# Altium integrated library Diode-SMD_V2.IntLib: 415 symbols (part 1 of 2) (continued)
## BAV19WS-TP_SOD323 (continued)
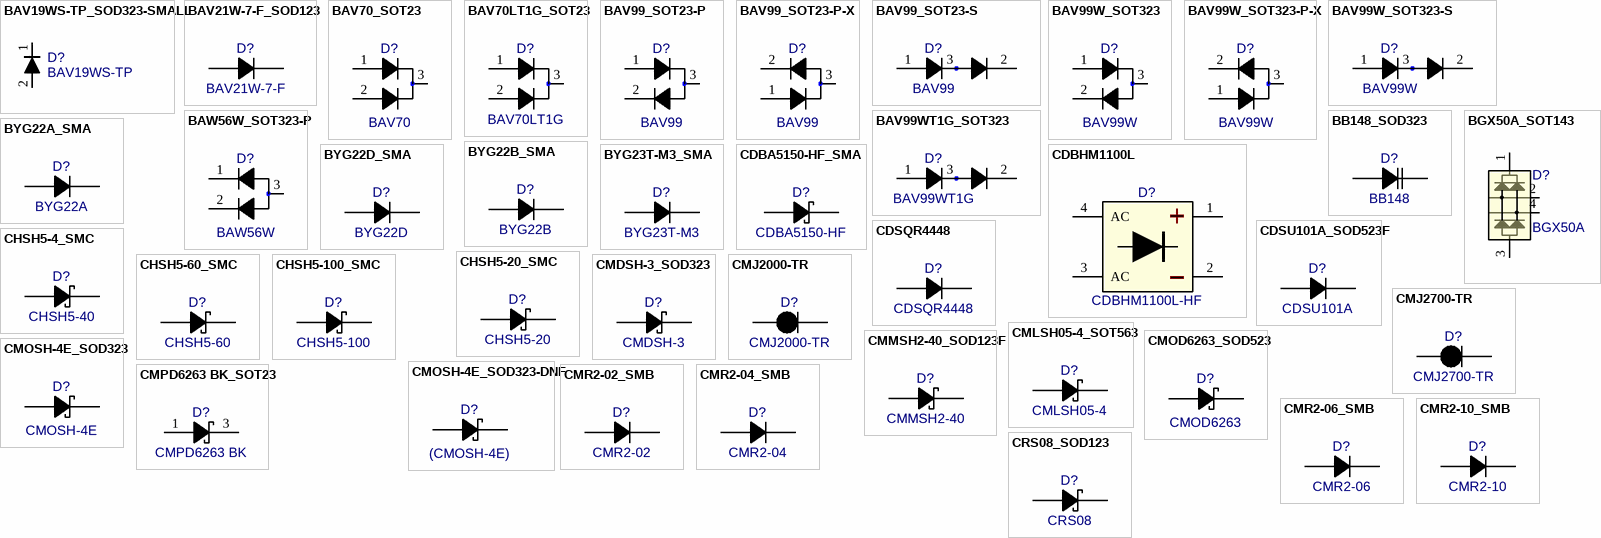
[diagram p3: symbols BAV19WS-TP_SOD323-SMALL to CRS08_SOD123]

## BAV19WS-TP_SOD323-SMALL
designator D?, comment BAV19WS-TP
Diode General  10V 200mA; Manufacturer: MCC; Package: SOD323; EDM-PN: *; Text2: *; Text1: *; Value: BAV19WS-TP; SAAB PN: *; Part Number: BAV19WS-TP; DCE Part No: *
footprint SOD323 (Diode, SOD323 2-Leads, Body 1.7x1.25mm, IPC Medium Density)
pins: 1 C, 2 A

## BAV21W-7-F_SOD123
designator D?, comment BAV21W-7-F
Diode Standard 200V 200mA; Manufacturer: Diodes; Package: SOD123; EDM-PN: *; Text2: *; Text1: *; Value: BAV21W-7-F; SAAB PN: *; Part Number: BAV21W-7-F; DCE Part No: *
footprint SOD123 (SOD 123 2.85x1.7mm)
pins: 1 C, 2 A

## BAV70_SOT23
designator D?, comment BAV70
Diode Signal 70V 200mA; Manufacturer: Various; Package: SOT23; EDM-PN: *; Text2: *; Text1: *; Value: BAV70; SAAB PN: *; Part Number: BAV70; DCE Part No: *
footprint SOT23 (SOT23, 3-Leads, Body 3.0x1.4mm (max), Pitch 0.95mm, IPC Medium Density)
pins: 1 A1, 2 A2, 3 C

## BAV70LT1G_SOT23
designator D?, comment BAV70LT1G
Diode Signal 70V 200mA; Manufacturer: On Semi; EDM-PN: DIO31; SAAB PN: 1AJB00002AEA; Package: SOT23; Text2: *; Text1: *; Value: BAV70LT1G; Part Number: BAV70LT1G; DCE Part No: *
footprint SOT23 (SOT23, 3-Leads, Body 3.0x1.4mm (max), Pitch 0.95mm, IPC Medium Density)
pins: 1 A1, 2 A2, 3 C

## BAV99_SOT23-P
designator D?, comment BAV99
Diode Dual Common Anode/Cathode; Manufacturer: Fairchild; Reutech PN: 5961-DA-0016; Package: SOT23; EDM-PN: *; Text2: *; Text1: *; Value: BAV99; SAAB PN: *; Part Number: BAV99; DCE Part No: *
footprint SOT23 (SOT23, 3-Leads, Body 3.0x1.4mm (max), Pitch 0.95mm, IPC Medium Density)
pins: 1 A1, 2 A2, 3 C

## BAV99_SOT23-P-X
designator D?, comment BAV99
Diode Dual Common Anode/Cathode; Manufacturer: Fairchild; Reutech PN: 5961-DA-0016; Package: SOT23; EDM-PN: *; Text2: *; Text1: *; Value: BAV99; SAAB PN: *; Part Number: BAV99; DCE Part No: *
footprint SOT23 (SOT23, 3-Leads, Body 3.0x1.4mm (max), Pitch 0.95mm, IPC Medium Density)
pins: 1 A1, 2 A2, 3 C

## BAV99_SOT23-S
designator D?, comment BAV99
Diode Dual Common Anode/Cathode; Manufacturer: Fairchild; Reutech PN: 5961-DA-0016; Package: SOT23; EDM-PN: *; Text2: *; Text1: *; Value: BAV99; SAAB PN: *; Part Number: BAV99; DCE Part No: *
footprint SOT23 (SOT23, 3-Leads, Body 3.0x1.4mm (max), Pitch 0.95mm, IPC Medium Density)
pins: 1 A1, 2 A2, 3 C

## BAV99W_SOT323
designator D?, comment BAV99W
Diode Dual Common Anode/Cathode; Manufacturer: NXP; Package: SOT323; EDM-PN: *; Text2: *; Text1: *; Value: BAV99W; SAAB PN: *; Part Number: BAV99W; DCE Part No: *
footprint SOT323 (SOT323 2.2x1.3mm)
pins: 1 A1, 2 A2, 3 C

## BAV99W_SOT323-P-X
designator D?, comment BAV99W
Diode Dual Common Anode/Cathode; Manufacturer: NXP; Package: SOT323; EDM-PN: *; Text2: *; Text1: *; Value: BAV99W; SAAB PN: *; Part Number: BAV99W; DCE Part No: *
footprint SOT323 (SOT323 2.2x1.3mm)
pins: 1 A1, 2 A2, 3 C

## BAV99W_SOT323-S
designator D?, comment BAV99W
Diode Dual Common Anode/Cathode; Manufacturer: NXP; Package: SOT323; EDM-PN: *; Text2: *; Text1: *; Value: BAV99W; SAAB PN: *; Part Number: BAV99W; DCE Part No: *
footprint SOT323 (SOT323 2.2x1.3mm)
pins: 1 A1, 2 A2, 3 C

## BAV99WT1G_SOT323
designator D?, comment BAV99WT1G
Diode Dual Common Anode/Cathode; Manufacturer: On Semi; Package: SC70-3; EDM-PN: *; Text2: *; Text1: *; Value: BAV99WT1G; SAAB PN: *; Part Number: BAV99WT1G; DCE Part No: *
footprint SC70-3 (SC70-3 2.1x1.24mm)
pins: 1 A1, 2 A2, 3 C

## BAW56W_SOT323-P
designator D?, comment BAW56W
Diode Dual Common Anode; Manufacturer: Various; Package: SOT323; EDM-PN: *; Text2: *; Text1: *; Value: BAW56W; SAAB PN: *; Part Number: BAW56W; DCE Part No: *
footprint SOT323 (SOT323 2.2x1.3mm)
pins: 1 A1, 2 A2, 3 C

## BB148_SOD323
designator D?, comment BB148
Diode VHF variable capacitance; Manufacturer: NXP; Package: SOD323; EDM-PN: *; Text2: *; Text1: *; Value: BB148; SAAB PN: *; Part Number: BB148; DCE Part No: *
footprint SOD323 (Diode, SOD323 2-Leads, Body 1.7x1.25mm, IPC Medium Density)
pins: 1 C, 2 A

## BGX50A_SOT143
designator D?, comment BGX50A
Diode Array Bridge; Manufacturer: Infineon; Package: SOT143; EDM-PN: *; Text2: *; Text1: *; Value: BGX50A; SAAB PN: *; Part Number: BGX50A; DCE Part No: *
footprint SOT143 (SOT143 2.9x1.3mm)
pins: 1, 2, 3, 4

## BYG22A_SMA
designator D?, comment BYG22A
Diode Ultrafast Rectifier; Manufacturer: Vishay; Package: SMA; EDM-PN: *; Text2: *; Text1: *; Value: BYG22A; SAAB PN: *; Part Number: BYG22A; DCE Part No: *
footprint SMA (SMA 5.6x2.95mm)
pins: 1 C, 2 A

## BYG22B_SMA
designator D?, comment BYG22B
Diode Ultrafast Rectifier; Manufacturer: Vishay; Package: SMA; EDM-PN: *; Text2: *; Text1: *; Value: BYG22B; SAAB PN: *; Part Number: BYG22B; DCE Part No: *
footprint SMA (SMA 5.6x2.95mm)
pins: 1 C, 2 A

## BYG22D_SMA
designator D?, comment BYG22D
Diode Ultrafast Rectifier; Manufacturer: Vishay; Package: SMA; EDM-PN: *; Text2: *; Text1: *; Value: BYG22D; SAAB PN: *; Part Number: BYG22D; DCE Part No: *
footprint SMA (SMA 5.6x2.95mm)
pins: 1 C, 2 A

## BYG23T-M3_SMA
designator D?, comment BYG23T-M3
Diode Ultrafast Rectifier 1A 1300V; Manufacturer: Vishay; Package: SMA; EDM-PN: *; Text2: *; Text1: *; Value: BYG23T-M3; SAAB PN: *; Part Number: BYG23T-M3; DCE Part No: *
footprint SMA (SMA 5.6x2.95mm)
pins: 1 C, 2 A

## CDBA5150-HF_SMA
designator D?, comment CDBA5150-HF
Diode Schottky Rectifier 150V 5A; Manufacturer: Comchip; Package: SMA; EDM-PN: *; Text2: *; Text1: *; Value: CDBA5150-HF; SAAB PN: *; Part Number: CDBA5150-HF; DCE Part No: *
footprint SMA (SMA 5.6x2.95mm)
pins: 1 C, 2 A

## CDBHM1100L
designator D?, comment CDBHM1100L-HF
Bridge Rectifier 100V 1A; Manufacturer: Comchip Tech; Package: DIODE-MBS; EDM-PN: *; Text2: *; Text1: *; Value: CDBHM1100L-HF; Part Number: CDBHM1100L-HF; DCE Part No: *
footprint DIODE-MBS (MBS 4.0x4.7)
pins: 1, 2, 3 AC, 4 AC

## CDSQR4448
designator D?
Diode Fast Switching Surface Mount; Manufacturer: Comchip Tech; Package: D0402; EDM-PN: *; Text2: *; Text1: *; Value: CDSQR4448; SAAB PN: *; Part Number: CDSQR4448; DCE Part No: *
footprint D0402 (Diode 0402 1.0x0.6mm)
pins: 1 C, 2 A

## CDSU101A_SOD523F
designator D?, comment CDSU101A
Diode Switching Surface Mount; Manufacturer: Comchip Tech; Package: SOD523F-ComChip; EDM-PN: *; Text2: *; Text1: *; Value: CDSU101A; SAAB PN: *; Part Number: CDSU101A; DCE Part No: *
footprint SOD523F-ComChip (SOD523F 1.7x0.9mm)
pins: 1 C, 2 A

## CHSH5-4_SMC
designator D?, comment CHSH5-40
Diode Schottky Rectifier; Manufacturer: Central Semi; Package: SMC; EDM-PN: *; Text2: *; Text1: *; Value: CHSH5-40; SAAB PN: *; Part Number: CHSH5-40; DCE Part No: *
footprint SMC (Molded Diode, 2-Leads, Body 6.9x5.8mm, IPC Medium Density)
pins: 1 C, 2 A

## CHSH5-20_SMC
designator D?, comment CHSH5-20
Diode Schottky Rectifier; Manufacturer: Central Semi; Package: SMC; EDM-PN: *; Text2: *; Text1: *; Value: CHSH5-20; SAAB PN: *; Part Number: CHSH5-20; DCE Part No: *
footprint SMC (Molded Diode, 2-Leads, Body 6.9x5.8mm, IPC Medium Density)
pins: 1 C, 2 A

## CHSH5-60_SMC
designator D?, comment CHSH5-60
Diode Schottky Rectifier; Manufacturer: Central Semi; Package: SMC; EDM-PN: *; Text2: *; Text1: *; Value: CHSH5-60; SAAB PN: *; Part Number: CHSH5-60; DCE Part No: *
footprint SMC (Molded Diode, 2-Leads, Body 6.9x5.8mm, IPC Medium Density)
pins: 1 C, 2 A

## CHSH5-100_SMC
designator D?, comment CHSH5-100
Diode Schottky Rectifier; Manufacturer: Central Semi; Package: SMC; EDM-PN: *; Text2: *; Text1: *; Value: CHSH5-100; SAAB PN: *; Part Number: CHSH5-100; DCE Part No: *
footprint SMC (Molded Diode, 2-Leads, Body 6.9x5.8mm, IPC Medium Density)
pins: 1 C, 2 A

## CMDSH-3_SOD323
designator D?, comment CMDSH-3
Diode Schottky 30V 100mA; Manufacturer: Central Semi; Package: SOD323; EDM-PN: *; Text2: *; Text1: *; Value: CMDSH-3; SAAB PN: *; Part Number: CMDSH-3; DCE Part No: *
footprint SOD323 (Diode, SOD323 2-Leads, Body 1.7x1.25mm, IPC Medium Density)
pins: 1 C, 2 A

## CMJ2000-TR
designator D?
Diode Current Limiting; Manufacturer: Central Semi; Package: SOD123FL; EDM-PN: *; Text2: *; Text1: *; Value: CMJ2000-TR; SAAB PN: *; Part Number: CMJ2000-TR; DCE Part No: *
footprint SOD123FL (SOD 123FL 2.85x1.7mm)
pins: 1 C, 2 A

## CMJ2700-TR
designator D?
Diode Current Limiting; Manufacturer: Central Semi; EDM-PN: DIO226; SAAB PN: 1AJA00049AEA; Package: SOD123FL; Text2: *; Text1: *; Value: CMJ2700-TR; Part Number: CMJ2700-TR; DCE Part No: *
footprint SOD123FL (SOD 123FL 2.85x1.7mm)
pins: 1 C, 2 A

## CMLSH05-4_SOT563
designator D?, comment CMLSH05-4
Diode Schottky (40Volt 500mA); Manufacturer: Central Semi; Package: SOT563-6; EDM-PN: *; Text2: *; Text1: *; Value: CMLSH05-4; SAAB PN: *; Part Number: CMLSH05-4; DCE Part No: *
footprint SOT563-6 (SOT563-6 1.2x1.6mm)
pins: 1 C, 2 C, 3 A, 4 A, 5 C, 6 C

## CMMSH2-40_SOD123F
designator D?, comment CMMSH2-40
Diode Schottky Rectifier 40V 2A; Manufacturer: Central Semi; Package: SOD123F; EDM-PN: *; Text2: *; Text1: *; Value: CMMSH2-40; SAAB PN: *; Part Number: CMMSH2-40; DCE Part No: *
footprint SOD123F (SOD 123F 2.85x1.7mm)
pins: 1 C, 2 A

## CMOD6263_SOD523
designator D?, comment value CMOD6263  (hidden comment: CMOD6263 TR PBFREE)
Diode Schottky 70V 15mA; Manufacturer: Central Semi; Package: SOD523; EDM-PN: *; Text2: *; Text1: *; SAAB PN: *; Part Number: CMOD6263 TR PBFREE; DCE Part No: *
footprint SOD523 (SOD523 1.25x0.85mm)
pins: 1 C, 2 A

## CMOSH-4E_SOD323
designator D?, comment value CMOSH-4E  (hidden comment: CMOSH-4E TR PBFREE)
Diode Schottky 40V 200mA; Manufacturer: Central Semi; Package: SOD323; EDM-PN: *; Text2: *; Text1: *; SAAB PN: *; Part Number: CMOSH-4E TR PBFREE; DCE Part No: *
footprint SOD323 (Diode, SOD323 2-Leads, Body 1.7x1.25mm, IPC Medium Density)
pins: 1 C, 2 A

## CMOSH-4E_SOD323-DNF
designator D?, comment value (CMOSH-4E)  (hidden comment: CMOSH-4E TR PBFREE)
Diode Schottky 40V 200mA - Do not Fit; Manufacturer: Central Semi; Part Number: DNF - CMOSH-4E TR PBFREE; Package: SOD323; EDM-PN: *; Text2: *; Text1: *; SAAB PN: *; DCE Part No: *
footprint SOD323 (Diode, SOD323 2-Leads, Body 1.7x1.25mm, IPC Medium Density)
pins: 1 C, 2 A

## CMPD6263 BK_SOT23
designator D?, comment CMPD6263 BK
Diode Schottky 70V 15mA; Manufacturer: Central Semi; Package: SOT23; EDM-PN: *; Text2: *; Text1: *; Value: CMPD6263 BK; SAAB PN: *; Part Number: CMPD6263 BK; DCE Part No: *
footprint SOT23 (SOT23, 3-Leads, Body 3.0x1.4mm (max), Pitch 0.95mm, IPC Medium Density)
pins: 1 A, 3 C

## CMR2-02_SMB
designator D?, comment CMR2-02
Diode Rectifier 2A 200V; Manufacturer: Central Semi; Package: SMB; EDM-PN: *; Text2: *; Text1: *; Value: CMR2-02; SAAB PN: *; Part Number: CMR2-02; DCE Part No: *
footprint SMB (SMB 4.75x3.94mm)
pins: 1 C, 2 A

## CMR2-04_SMB
designator D?, comment CMR2-04
Diode Rectifier 2A 400V; Manufacturer: Central Semi; Reutech PN: 5961-RE-0059; Package: SMB; EDM-PN: *; Text2: *; Text1: *; Value: CMR2-04; SAAB PN: *; Part Number: CMR2-04; DCE Part No: *
footprint SMB (SMB 4.75x3.94mm)
pins: 1 C, 2 A

## CMR2-06_SMB
designator D?, comment CMR2-06
Diode Rectifier 2A 600V; Manufacturer: Central Semi; Package: SMB; EDM-PN: *; Text2: *; Text1: *; Value: CMR2-06; SAAB PN: *; Part Number: CMR2-06; DCE Part No: *
footprint SMB (SMB 4.75x3.94mm)
pins: 1 C, 2 A

## CMR2-10_SMB
designator D?, comment CMR2-10
Diode Rectifier 2A 1000V; Manufacturer: Central Semi; Package: SMB; EDM-PN: *; Text2: *; Text1: *; Value: CMR2-10; SAAB PN: *; Part Number: CMR2-10; DCE Part No: *
footprint SMB (SMB 4.75x3.94mm)
pins: 1 C, 2 A

## CRS08_SOD123
designator D?, comment CRS08
Diode Schottky Barrier Rectifier; Manufacturer: Toshiba; Package: TOSHIBA-3-2A1A; EDM-PN: *; Text2: *; Text1: *; Value: CRS08; SAAB PN: *; Part Number: CRS08; DCE Part No: *
footprint TOSHIBA-3-2A1A (TOSHIBA-3-2A1A 2.5x1.6mm)
pins: 1 C, 2 A

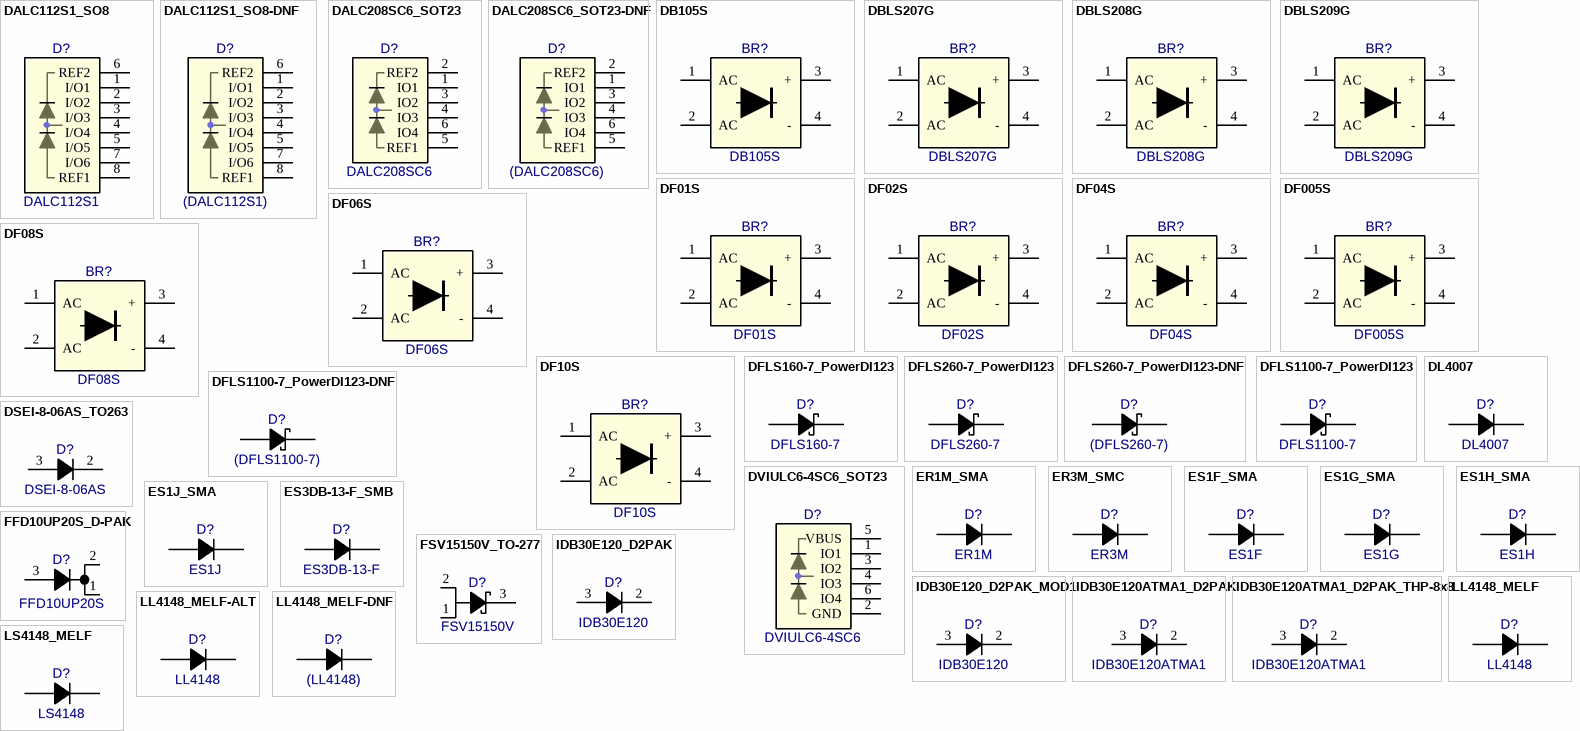
[diagram p4: symbols DALC112S1_SO8 to LS4148_MELF]

## DALC112S1_SO8
designator D?, comment DALC112S1
Diode Array Low Capacitance; Manufacturer: ST; EDM-PN: DIO230; Package: SO8; Text2: *; Text1: *; Value: DALC112S1; SAAB PN: *; Part Number: DALC112S1; DCE Part No: *
footprint SO8 (SOIC, 8-Leads, Body 5.0x4.0mm (max), Pitch 1.27mm, IPC Medium Density)
pins: 1 I/O1, 2 I/O2, 3 I/O3, 4 I/O4, 5 I/O5, 6 REF2, 7 I/O6, 8 REF1

## DALC112S1_SO8-DNF
designator D?, comment value (DALC112S1)  (hidden comment: DALC112S1-DNF)
Diode Array Low Capacitance - Do not Fit; Manufacturer: ST; Part Number: DNF - DALC112S1; EDM-PN: DIO230; Package: SO8; Text2: *; Text1: *; SAAB PN: *; DCE Part No: *
footprint SO8 (SOIC, 8-Leads, Body 5.0x4.0mm (max), Pitch 1.27mm, IPC Medium Density)
pins: 1 I/O1, 2 I/O2, 3 I/O3, 4 I/O4, 5 I/O5, 6 REF2, 7 I/O6, 8 REF1

## DALC208SC6_SOT23
designator D?, comment DALC208SC6
Diode Array Low Capacitance; Manufacturer: ST; EDM-PN: DIO33; Package: SOT23; Text2: *; Text1: *; Value: DALC208SC6; SAAB PN: *; Part Number: DALC208SC6; DCE Part No: *
footprint SOT23-6 (SOT23, 6-Leads, Body 3.0x2.9mm (max), Pitch 0.95mm, IPC Medium Density)
pins: 1 IO1, 2 REF2, 3 IO2, 4 IO3, 5 REF1, 6 IO4

## DALC208SC6_SOT23-DNF
designator D?, comment value (DALC208SC6)  (hidden comment: DALC208SC6)
Diode Array Low Capacitance - Do not Fit; Manufacturer: ST; Part Number: DNF - DALC208SC6; EDM-PN: DIO33; Package: SOT23; Text2: *; Text1: *; SAAB PN: *; DCE Part No: *
footprint SOT23-6 (SOT23, 6-Leads, Body 3.0x2.9mm (max), Pitch 0.95mm, IPC Medium Density)
pins: 1 IO1, 2 REF2, 3 IO2, 4 IO3, 5 REF1, 6 IO4

## DB105S
designator BR?
Diode Bridge Rectifier; Manufacturer: DC Components; Package: DB-1S; EDM-PN: *; Text2: *; Text1: *; Value: DB105S; SAAB PN: *; Part Number: DB105S; DCE Part No: *
footprint DB-1S (DB-1S 6.8x8.5mm)
pins: 1 AC, 2 AC, 3 +, 4 -

## DBLS207G
designator BR?
Diode Bridge Rectifier 1000V 2Amp; Manufacturer: Taiwan Semi; Package: DB-1S; EDM-PN: *; Text2: *; Text1: *; Value: DBLS207G; SAAB PN: *; Part Number: DBLS207G; DCE Part No: *
footprint DB-1S (DB-1S 6.8x8.5mm)
pins: 1 AC, 2 AC, 3 +, 4 -

## DBLS208G
designator BR?
Diode Bridge Rectifier 1200V 2Amp; Manufacturer: Taiwan Semi; Package: DB-1S; EDM-PN: *; Text2: *; Text1: *; Value: DBLS208G; SAAB PN: *; Part Number: DBLS208G; DCE Part No: *
footprint DB-1S (DB-1S 6.8x8.5mm)
pins: 1 AC, 2 AC, 3 +, 4 -

## DBLS209G
designator BR?
Diode Bridge Rectifier 1400V 2Amp; Manufacturer: Taiwan Semi; Package: DB-1S; EDM-PN: *; Text2: *; Text1: *; Value: DBLS209G; SAAB PN: *; Part Number: DBLS209G; DCE Part No: *
footprint DB-1S (DB-1S 6.8x8.5mm)
pins: 1 AC, 2 AC, 3 +, 4 -

## DF01S
designator BR?
Diode Bridge Rectifier 100V 1Amp; Manufacturer: Diodes; Package: DFxxxS; EDM-PN: *; Text2: *; Text1: *; Value: DF01S; SAAB PN: *; Part Number: DF01S; DCE Part No: *
footprint DFxxxS (DFxxxS 6.8x8.5mm)
pins: 1 AC, 2 AC, 3 +, 4 -

## DF02S
designator BR?
Diode Bridge Rectifier 200V 1Amp; Manufacturer: Diodes; Package: DFxxxS; EDM-PN: *; Text2: *; Text1: *; Value: DF02S; SAAB PN: *; Part Number: DF02S; DCE Part No: *
footprint DFxxxS (DFxxxS 6.8x8.5mm)
pins: 1 AC, 2 AC, 3 +, 4 -

## DF04S
designator BR?
Diode Bridge Rectifier 400V 1Amp; Manufacturer: Diodes; Package: DFxxxS; EDM-PN: *; Text2: *; Text1: *; Value: DF04S; SAAB PN: *; Part Number: DF04S; DCE Part No: *
footprint DFxxxS (DFxxxS 6.8x8.5mm)
pins: 1 AC, 2 AC, 3 +, 4 -

## DF005S
designator BR?
Diode Bridge Rectifier 50V 1Amp; Manufacturer: Diodes; Package: DFxxxS; EDM-PN: *; Text2: *; Text1: *; Value: DF005S; SAAB PN: *; Part Number: DF005S; DCE Part No: *
footprint DFxxxS (DFxxxS 6.8x8.5mm)
pins: 1 AC, 2 AC, 3 +, 4 -

## DF06S
designator BR?
Diode Bridge Rectifier 600V 1Amp; Manufacturer: Diodes; Package: DFxxxS; EDM-PN: *; Text2: *; Text1: *; Value: DF06S; SAAB PN: *; Part Number: DF06S; DCE Part No: *
footprint DFxxxS (DFxxxS 6.8x8.5mm)
pins: 1 AC, 2 AC, 3 +, 4 -

## DF08S
designator BR?
Diode Bridge Rectifier 800V 1Amp; Manufacturer: Diodes; Package: DFxxxS; EDM-PN: *; Text2: *; Text1: *; Value: DF08S; SAAB PN: *; Part Number: DF08S; DCE Part No: *
footprint DFxxxS (DFxxxS 6.8x8.5mm)
pins: 1 AC, 2 AC, 3 +, 4 -

## DF10S
designator BR?
Diode Bridge Rectifier 1000V 1Amp; Manufacturer: Diodes; Package: DFxxxS; EDM-PN: *; Text2: *; Text1: *; Value: DF10S; SAAB PN: *; Part Number: DF10S; DCE Part No: *
footprint DFxxxS (DFxxxS 6.8x8.5mm)
pins: 1 AC, 2 AC, 3 +, 4 -

## DFLS160-7_PowerDI123
designator D?, comment DFLS160-7
Diode Schottky Rectifier 60V 1A; Manufacturer: Diodes; Package: PowerDI123; EDM-PN: *; Text2: *; Text1: *; Value: DFLS160-7; SAAB PN: *; Part Number: DFLS160-7; DCE Part No: *
footprint PowerDI123 (PowerDI 123 2.8x1.78mm)
pins: 1 C, 2 A

## DFLS260-7_PowerDI123
designator D?, comment DFLS260-7
Diode Schottky Rectifier 60V 2A; Manufacturer: Diodes; Package: PowerDI123; EDM-PN: *; Text2: *; Text1: *; Value: DFLS260-7; SAAB PN: *; Part Number: DFLS260-7; DCE Part No: *
footprint PowerDI123 (PowerDI 123 2.8x1.78mm)
pins: 1 C, 2 A

## DFLS260-7_PowerDI123-DNF
designator D?, comment value (DFLS260-7)  (hidden comment: DFLS260-7)
Diode Schottky Rectifier 60V 2A - Do not Fit; Manufacturer: Diodes; Package: PowerDI123; EDM-PN: *; Text2: *; Text1: *; SAAB PN: *; Part Number: DFLS260-7; DCE Part No: *
footprint PowerDI123 (PowerDI 123 2.8x1.78mm)
pins: 1 C, 2 A

## DFLS1100-7_PowerDI123
designator D?, comment DFLS1100-7
Diode Schottky Rectifier 100V 1A; Manufacturer: Diodes; Reutech PN: 5961-ST-0040; Package: PowerDI123; EDM-PN: *; Text2: *; Text1: *; Value: DFLS1100-7; SAAB PN: *; Part Number: DFLS1100-7; DCE Part No: *
footprint PowerDI123 (PowerDI 123 2.8x1.78mm)
pins: 1 C, 2 A

## DFLS1100-7_PowerDI123-DNF
designator D?, comment value (DFLS1100-7)  (hidden comment: DFLS1100-7)
Diode Schottky Rectifier 100V 1A - Do not Fit; Manufacturer: Diodes; Reutech PN: 5961-ST-0040; Package: PowerDI123; EDM-PN: *; Text2: *; Text1: *; SAAB PN: *; Part Number: DFLS1100-7; DCE Part No: *
footprint PowerDI123 (PowerDI 123 2.8x1.78mm)
pins: 1 C, 2 A

## DL4007
designator D?
Diode Rectifier 1Amp 1000V; Manufacturer: Diotes; Package: DO-213AB; EDM-PN: *; Text2: *; Text1: *; Value: DL4007; SAAB PN: *; Part Number: DL4007; DCE Part No: *
footprint DO-213AB (DO-213AB 5.0x2.5mm)
pins: 1 C, 2 A

## DSEI-8-06AS_TO263
designator D?, comment DSEI-8-06AS
Diode Fast Recovery (FRED); Manufacturer: IXYS; Package: TO263-AB; EDM-PN: *; Text2: *; Text1: *; Value: DSEI-8-06AS; SAAB PN: *; Part Number: DSEI-8-06AS; DCE Part No: *
footprint TO263-AB (TO263-AB 9.4x10.4mm)
pins: 2 C, 3 A

## DVIULC6-4SC6_SOT23
designator D?, comment DVIULC6-4SC6
Diode ESD Protection  Array Low Capacitance; Manufacturer: ST; EDM-PN: DIO265; Package: SOT23-6; Text2: *; Text1: *; Value: DVIULC6-4SC6; SAAB PN: *; Part Number: DVIULC6-4SC6; DCE Part No: *
footprint SOT23-6 (SOT23, 6-Leads, Body 3.0x2.9mm (max), Pitch 0.95mm, IPC Medium Density)
pins: 1 IO1, 2 GND, 3 IO2, 4 IO3, 5 VBUS, 6 IO4

## ER1M_SMA
designator D?, comment ER1M
Diode Ultra-Fast Rectifier 1000V 1A; Manufacturer: MCC/Diotec; Package: SMA; EDM-PN: *; Text2: *; Text1: *; Value: ER1M; SAAB PN: *; Part Number: ER1M; DCE Part No: *
footprint SMA (SMA 5.6x2.95mm)
pins: 1 C, 2 A

## ER3M_SMC
designator D?, comment ER3M
Diode Rectifier 1000V 3A; Manufacturer: Diotec; Package: SMC; EDM-PN: *; Text2: *; Text1: *; Value: ER3M; SAAB PN: *; Part Number: ER3M; DCE Part No: *
footprint SMC (Molded Diode, 2-Leads, Body 6.9x5.8mm, IPC Medium Density)
pins: 1 C, 2 A

## ES1F_SMA
designator D?, comment ES1F
Diode General 300V 1A; Manufacturer: On Semi; Package: SMA; EDM-PN: *; Text2: *; Text1: *; Value: ES1F; SAAB PN: *; Part Number: ES1F; DCE Part No: *
footprint SMA (SMA 5.6x2.95mm)
pins: 1 C, 2 A

## ES1G_SMA
designator D?, comment ES1G
Diode General 400V 1A; Manufacturer: On Semi; Package: SMA; EDM-PN: *; Text2: *; Text1: *; Value: ES1G; SAAB PN: *; Part Number: ES1G; DCE Part No: *
footprint SMA (SMA 5.6x2.95mm)
pins: 1 C, 2 A

## ES1H_SMA
designator D?, comment ES1H
Diode General 500V 1A; Manufacturer: On Semi; Package: SMA; EDM-PN: *; Text2: *; Text1: *; Value: ES1H; SAAB PN: *; Part Number: ES1H; DCE Part No: *
footprint SMA (SMA 5.6x2.95mm)
pins: 1 C, 2 A

## ES1J_SMA
designator D?, comment ES1J
Diode General 600V 1A; Manufacturer: On Semi; Package: SMA; EDM-PN: *; Text2: *; Text1: *; Value: ES1J; SAAB PN: *; Part Number: ES1J; DCE Part No: *
footprint SMA (SMA 5.6x2.95mm)
pins: 1 C, 2 A

## ES3DB-13-F_SMB
designator D?, comment ES3DB-13-F
Diode Super-fast Power Rectifier 200V 3A; Manufacturer: Diodes; Package: SMB; EDM-PN: *; Text2: *; Text1: *; Value: ES3DB-13-F; SAAB PN: *; Part Number: ES3DB-13-F; DCE Part No: *
footprint SMB (SMB 4.75x3.94mm)
pins: 1 C, 2 A

## FFD10UP20S_D-PAK
designator D?, comment FFD10UP20S
Diode Ultra Fast Rectifier (200Volt 10A); Manufacturer: On Semi; Reutech PN: 5961-GQ-0108; Package: D-PAK; EDM-PN: *; Text2: *; Text1: *; Value: FFD10UP20S; SAAB PN: *; Part Number: FFD10UP20S; DCE Part No: *
footprint D-PAK (D-Pak 6.73x6.22mm)
pins: 1 A, 2 C, 3 A

## FSV15150V_TO-277
designator D?, comment FSV15150V
Diode Schottky Ultra-Low VF 150V 15A; Manufacturer: On Semi; Package: TO-277; EDM-PN: *; Text2: *; Text1: *; Value: FSV15150V; SAAB PN: *; Part Number: FSV15150V; DCE Part No: *
footprint TO-277 (TO-277 4.3x6.1mm)
pins: 1 A, 2 A, 3 C

## IDB30E120_D2PAK
designator D?, comment IDB30E120
Diode Fast Switching Emitter Controlled 50A 1200V; Manufacturer: Infineon; Reutech PN: 5961-ST-0049; Package: D2PAK; EDM-PN: *; Text2: *; Text1: *; Value: IDB30E120; SAAB PN: *; Part Number: IDB30E120; DCE Part No: *
footprint D2PAK (D2-PAK, 3-Pads, Body 9.4x10.4mm (max), IPC Medium Density)
pins: 2 C, 3 A

## IDB30E120_D2PAK_MOD1
designator D?, comment IDB30E120
Diode Fast Switching Emitter Controlled 50A 1200V; Manufacturer: Infineon; Reutech PN: 5961-ST-0049; Package: D2PAK-MOD1; EDM-PN: *; Text2: *; Text1: *; Value: IDB30E120; SAAB PN: *; Part Number: IDB30E120; DCE Part No: *
footprint D2PAK-MOD1 (D2-PAK, 3-Pads, Body 9.4x10.4mm (max), IPC Medium Density)
pins: 2 C, 3 A

## IDB30E120ATMA1_D2PAK
designator D?, comment IDB30E120ATMA1
Diode Fast Switching Emitter Controlled 50A 1200V; Manufacturer: Infineon; Reutech PN: 5961-ST-0049; Package: D2PAK; EDM-PN: *; Text2: *; Text1: *; Value: IDB30E120ATMA1; SAAB PN: *; Part Number: IDB30E120ATMA1; DCE Part No: *
footprint D2PAK (D2-PAK, 3-Pads, Body 9.4x10.4mm (max), IPC Medium Density)
pins: 2 C, 3 A

## IDB30E120ATMA1_D2PAK_THP-8x8
designator D?, comment IDB30E120ATMA1
Diode Fast Switching Emitter Controlled 50A 1200V; Manufacturer: Infineon; Reutech PN: 5961-ST-0049; Package: TO-263-THERM-HOLE-8x8; EDM-PN: *; Text2: *; Text1: *; Value: IDB30E120ATMA1; SAAB PN: *; Part Number: IDB30E120ATMA1; DCE Part No: *
footprint TO-263-THERM-HOLE-8x8 (TO-263, 3-Pads, Body 9.4x10.4mm (max), IPC Medium Density)
pins: 2 C, 3 A

## LL4148_MELF
designator D?, comment LL4148
Diode Fast Switching Surface Mount; Manufacturer: On Semi; Reutech PN: 5961-DSW-0012; Package: SOD80; EDM-PN: *; Text2: *; Text1: *; Value: LL4148; SAAB PN: *; Part Number: LL4148; DCE Part No: *
footprint SOD80 (Diode, SOD80 2-Leads, Body 3.5x1.4mm, IPC Medium Density)
pins: 1 C, 2 A

## LL4148_MELF-ALT
designator D?, comment LL4148
Diode Fast Switching Surface Mount; Manufacturer: On Semi; Reutech PN: 5961-DSW-0012; Package: SOD80-ALT; EDM-PN: *; Text2: *; Text1: *; Value: LL4148; SAAB PN: *; Part Number: LL4148; DCE Part No: *
footprint SOD80-ALT (Diode, SOD80 2-Leads, Body 3.5x1.4mm, IPC Medium Density)
pins: 1 C, 2 A

## LL4148_MELF-DNF
designator D?, comment value (LL4148)  (hidden comment: LL4148-DNF)
Diode Fast Switching Surface Mount - Do not Fit; Manufacturer: On Semi; Part Number: DNF - LL4148; Reutech PN: 5961-DSW-0012; Package: SOD80; EDM-PN: *; Text2: *; Text1: *; SAAB PN: *; DCE Part No: *
footprint SOD80 (Diode, SOD80 2-Leads, Body 3.5x1.4mm, IPC Medium Density)
pins: 1 C, 2 A

## LS4148_MELF
designator D?, comment LS4148
Diode Fast Switching; Manufacturer: Vishay; EDM-PN: DIO102; Package: SOD80; Text2: *; Text1: *; Value: LS4148; SAAB PN: *; Part Number: LS4148; DCE Part No: *
footprint SOD80 (Diode, SOD80 2-Leads, Body 3.5x1.4mm, IPC Medium Density)
pins: 1 C, 2 A

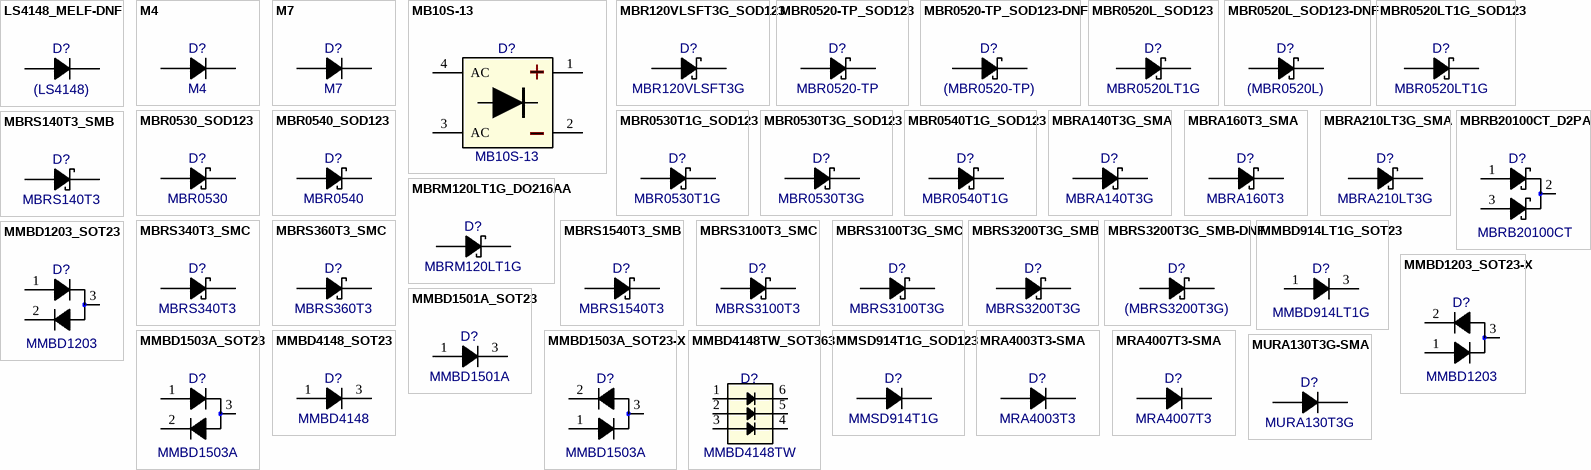
[diagram p5: symbols LS4148_MELF-DNF to MURA130T3G-SMA]

## LS4148_MELF-DNF
designator D?, comment value (LS4148)  (hidden comment: LS4148)
Diode Fast Switching - Do not Fit; Manufacturer: Vishay; EDM-PN: DIO102; Package: SOD80; Text2: *; Text1: *; SAAB PN: *; Part Number: LS4148; DCE Part No: *
footprint SOD80 (Diode, SOD80 2-Leads, Body 3.5x1.4mm, IPC Medium Density)
pins: 1 C, 2 A

## M4
designator D?
Diode Rectifier 1Amp 400V; Manufacturer: Various; Package: DO-214AC; EDM-PN: *; Text2: *; Text1: *; Value: M4; SAAB PN: *; Part Number: M4; DCE Part No: *
footprint DO-214AC (DO-214AC 4.5x2.9mm)
pins: 1 C, 2 A

## M7
designator D?
Diode Rectifier 1Amp 1000V; Manufacturer: Various; Package: DO-214AC; EDM-PN: *; Text2: *; Text1: *; Value: M7; SAAB PN: *; Part Number: M7; DCE Part No: *
footprint DO-214AC (DO-214AC 4.5x2.9mm)
pins: 1 C, 2 A

## MB10S-13
designator D?
Bridge Rectifier 1000V 0.8A; Manufacturer: Diodes; Value: CDBHM1100L-HF; Package: DIODE-MBS; EDM-PN: *; Text2: *; Text1: *; Part Number: MB10S-13; DCE Part No: *
footprint DIODE-MBS (MBS 4.0x4.7)
pins: 1, 2, 3 AC, 4 AC

## MBR120VLSFT3G_SOD123
designator D?, comment MBR120VLSFT3G
Diode Schottky Power Rectifier 1A 20V; Manufacturer: On Semi; EDM-PN: DIO250; Package: SOD123; Text2: *; Text1: *; Value: MBR120VLSFT3G; SAAB PN: *; Part Number: MBR120VLSFT3G; DCE Part No: *
footprint SOD123 (SOD 123 2.85x1.7mm)
pins: 1 C, 2 A

## MBR0520-TP_SOD123
designator D?, comment MBR0520-TP
Diode Schottky Power Rectifier 0.5A 20V; Manufacturer: MCC; Package: SOD123; EDM-PN: *; Text2: *; Text1: *; Value: MBR0520-TP; SAAB PN: *; Part Number: MBR0520-TP; DCE Part No: *
footprint SOD123 (SOD 123 2.85x1.7mm)
pins: 1 C, 2 A

## MBR0520-TP_SOD123-DNF
designator D?, comment value (MBR0520-TP)  (hidden comment: MBR0520-TP-DNF)
Diode Schottky Power Rectifier 0.5A 20V - Do not Fit; Manufacturer: MCC; Part Number: DNF - MBR0520-TP; Package: SOD123; EDM-PN: *; Text2: *; Text1: *; SAAB PN: *; DCE Part No: *
footprint SOD123 (SOD 123 2.85x1.7mm)
pins: 1 C, 2 A

## MBR0520L_SOD123
designator D?, comment Part Number: MBR0520LT1G  (hidden comment: MBR0520L)
Diode Schottky Power Rectifier 0.5A 20V; Manufacturer: On Semi; EDM-PN: DIO80; Value: MBR0520LT1G; Package: SOD123; Text2: *; Text1: *; SAAB PN: *; DCE Part No: *
footprint SOD123 (SOD 123 2.85x1.7mm)
pins: 1 C, 2 A

## MBR0520L_SOD123-DNF
designator D?, comment value (MBR0520L)  (hidden comment: MBR0520L-DNF)
Diode Schottky Power Rectifier 0.5A 20V - Do not Fit; Manufacturer: Fairchild; Part Number: DNF - MBR0520L; Package: SOD123; EDM-PN: *; Text2: *; Text1: *; SAAB PN: *; DCE Part No: *
footprint SOD123 (SOD 123 2.85x1.7mm)
pins: 1 C, 2 A

## MBR0520LT1G_SOD123
designator D?, comment MBR0520LT1G
Diode Schottky Power Rectifier 20V 0.5A; Manufacturer: On Semi; EDM-PN: DIO80; Package: SOD123; Text2: *; Text1: *; Value: MBR0520LT1G; SAAB PN: *; Part Number: MBR0520LT1G; DCE Part No: *
footprint SOD123 (SOD 123 2.85x1.7mm)
pins: 1 C, 2 A

## MBR0530_SOD123
designator D?, comment MBR0530
Diode Schottky Power Rectifier 0.5A 30V; Manufacturer: Fairchild; Package: SOD123; EDM-PN: *; Text2: *; Text1: *; Value: MBR0530; SAAB PN: *; Part Number: MBR0530; DCE Part No: *
footprint SOD123 (SOD 123 2.85x1.7mm)
pins: 1 C, 2 A

## MBR0530T1G_SOD123
designator D?, comment MBR0530T1G
Diode Schottky Power Rectifier 0.5A 30V; Manufacturer: On Semi; Package: SOD123; EDM-PN: *; Text2: *; Text1: *; Value: MBR0530T1G; SAAB PN: *; Part Number: MBR0530T1G; DCE Part No: *
footprint SOD123 (SOD 123 2.85x1.7mm)
pins: 1 C, 2 A

## MBR0530T3G_SOD123
designator D?, comment MBR0530T3G
Diode Schottky Power Rectifier 0.5A 30V; Manufacturer: On Semi; Package: SOD123; EDM-PN: *; Text2: *; Text1: *; Value: MBR0530T3G; SAAB PN: *; Part Number: MBR0530T3G; DCE Part No: *
footprint SOD123 (SOD 123 2.85x1.7mm)
pins: 1 C, 2 A

## MBR0540_SOD123
designator D?, comment MBR0540
Diode Schottky Power Rectifier 0.5A 40V; Manufacturer: Fairchild; EDM-PN: DIO255; Package: SOD123; Text2: *; Text1: *; Value: MBR0540; SAAB PN: *; Part Number: MBR0540; DCE Part No: *
footprint SOD123 (SOD 123 2.85x1.7mm)
pins: 1 C, 2 A

## MBR0540T1G_SOD123
designator D?, comment MBR0540T1G
Diode Schottky Power Rectifier 0.5A 40V; Manufacturer: On Semi; Package: SOD123; EDM-PN: *; Text2: *; Text1: *; Value: MBR0540T1G; SAAB PN: *; Part Number: MBR0540T1G; DCE Part No: *
footprint SOD123 (SOD 123 2.85x1.7mm)
pins: 1 C, 2 A

## MBRA140T3G_SMA
designator D?, comment MBRA140T3G
Diode Schottky Power Rectifier 1A 40V; Manufacturer: On Semi; Package: SMA; EDM-PN: *; Text2: *; Text1: *; Value: MBRA140T3G; SAAB PN: *; Part Number: MBRA140T3G; DCE Part No: *
footprint SMA (SMA 5.6x2.95mm)
pins: 1 C, 2 A

## MBRA160T3_SMA
designator D?, comment MBRA160T3
Diode Schottky Power Rectifier 1A 60V; Manufacturer: On Semi; Package: SMA; EDM-PN: *; Text2: *; Text1: *; Value: MBRA160T3; SAAB PN: *; Part Number: MBRA160T3; DCE Part No: *
footprint SMA (SMA 5.6x2.95mm)
pins: 1 C, 2 A

## MBRA210LT3G_SMA
designator D?, comment MBRA210LT3G
Diode Schottky Power Rectifier 2A 10V; Manufacturer: On Semi; Package: SMA; EDM-PN: *; Text2: *; Text1: *; Value: MBRA210LT3G; SAAB PN: *; Part Number: MBRA210LT3G; DCE Part No: *
footprint SMA (SMA 5.6x2.95mm)
pins: 1 C, 2 A

## MBRB20100CT_D2PAK
designator D?, comment MBRB20100CT
Diode Schottky 100V 20A; Manufacturer: On Semi; Reutech PN: 5961-ST-0035; Package: D2PAK; EDM-PN: *; Text2: *; Text1: *; Value: MBRB20100CT; SAAB PN: *; Part Number: MBRB20100CT; DCE Part No: *
footprint D2PAK (D2-PAK, 3-Pads, Body 9.4x10.4mm (max), IPC Medium Density)
pins: 1 A1, 2 C, 3 A2

## MBRM120LT1G_DO216AA
designator D?, comment MBRM120LT1G
Diode Schottky Power Rectifier 20V 1A; Manufacturer: On Semi; Package: DO-216AA; EDM-PN: *; Text2: *; Text1: *; Value: MBRM120LT1G; SAAB PN: *; Part Number: MBRM120LT1G; DCE Part No: *
footprint DO-216AA (DO216-AA 3.9x2.05mm)
pins: 1 C, 2 A

## MBRS140T3_SMB
designator D?, comment MBRS140T3
Diode Schottky Power Rectifier; Manufacturer: On Semi; Package: SMB; EDM-PN: *; Text2: *; Text1: *; Value: MBRS140T3; SAAB PN: *; Part Number: MBRS140T3; DCE Part No: *
footprint SMB (SMB 4.75x3.94mm)
pins: 1 C, 2 A

## MBRS340T3_SMC
designator D?, comment MBRS340T3
Diode Schottky Power Rectifier; Manufacturer: On Semi; Package: SMC; EDM-PN: *; Text2: *; Text1: *; Value: MBRS340T3; SAAB PN: *; Part Number: MBRS340T3; DCE Part No: *
footprint SMC (Molded Diode, 2-Leads, Body 6.9x5.8mm, IPC Medium Density)
pins: 1 C, 2 A

## MBRS360T3_SMC
designator D?, comment MBRS360T3
Diode Schottky Power Rectifier; Manufacturer: On Semi; Package: SMC; EDM-PN: *; Text2: *; Text1: *; Value: MBRS360T3; SAAB PN: *; Part Number: MBRS360T3; DCE Part No: *
footprint SMC (Molded Diode, 2-Leads, Body 6.9x5.8mm, IPC Medium Density)
pins: 1 C, 2 A

## MBRS1540T3_SMB
designator D?, comment MBRS1540T3
Diode Schottky Power Rectifier; Manufacturer: On Semi; Package: SMB; EDM-PN: *; Text2: *; Text1: *; Value: MBRS1540T3; SAAB PN: *; Part Number: MBRS1540T3; DCE Part No: *
footprint SMB (SMB 4.75x3.94mm)
pins: 1 C, 2 A

## MBRS3100T3_SMC
designator D?, comment MBRS3100T3
Diode Schottky Power Rectifier 100V 3A; Manufacturer: On Semi; Package: SMC; EDM-PN: *; Text2: *; Text1: *; Value: MBRS3100T3; SAAB PN: *; Part Number: MBRS3100T3; DCE Part No: *
footprint SMC (Molded Diode, 2-Leads, Body 6.9x5.8mm, IPC Medium Density)
pins: 1 C, 2 A

## MBRS3100T3G_SMC
designator D?, comment MBRS3100T3G
Diode Schottky Power Rectifier 100V 3A; Manufacturer: On Semi; Package: SMC; EDM-PN: *; Text2: *; Text1: *; Value: MBRS3100T3G; SAAB PN: *; Part Number: MBRS3100T3G; DCE Part No: *
footprint SMC (Molded Diode, 2-Leads, Body 6.9x5.8mm, IPC Medium Density)
pins: 1 C, 2 A

## MBRS3200T3G_SMB
designator D?, comment MBRS3200T3G
Diode Schottky Power Rectifier 3A; Manufacturer: On Semi; Reutech PN: 5961-ST-0038; Package: SMB; EDM-PN: *; Text2: *; Text1: *; Value: MBRS3200T3G; SAAB PN: *; Part Number: MBRS3200T3G; DCE Part No: *
footprint SMB (SMB 4.75x3.94mm)
pins: 1 C, 2 A

## MBRS3200T3G_SMB-DNF
designator D?, comment value (MBRS3200T3G)  (hidden comment: MBRS3200T3G-DNF)
Diode Schottky Power Rectifier 3A - Do not Fit; Manufacturer: On Semi; Part Number: DNF-MBRS3200T3G; Package: SMB; EDM-PN: *; Text2: *; Text1: *; SAAB PN: *; DCE Part No: *
footprint SMB (SMB 4.75x3.94mm)
pins: 1 C, 2 A

## MMBD914LT1G_SOT23
designator D?, comment MMBD914LT1G
Diode Small Signal 100V 200mA; Manufacturer: On Semi; Package: SOT23; EDM-PN: *; Text2: *; Text1: *; Value: MMBD914LT1G; Reutech PN: *; SAAB PN: *; Part Number: MMBD914LT1G; DCE Part No: *
footprint SOT23 (SOT23, 3-Leads, Body 3.0x1.4mm (max), Pitch 0.95mm, IPC Medium Density)
pins: 1 A, 3 C

## MMBD1203_SOT23
designator D?, comment MMBD1203
Diode 100V 200mA; Manufacturer: Fairchild; Reutech PN: 5961-SW-0021; Package: SOT23; EDM-PN: *; Text2: *; Text1: *; Value: MMBD1203; SAAB PN: *; Part Number: MMBD1203; DCE Part No: *
footprint SOT23 (SOT23, 3-Leads, Body 3.0x1.4mm (max), Pitch 0.95mm, IPC Medium Density)
pins: 1 A1, 2 A2, 3 C

## MMBD1203_SOT23-X
designator D?, comment MMBD1203
Diode 100V 200mA; Manufacturer: Fairchild; Reutech PN: 5961-SW-0021; Package: SOT23; EDM-PN: *; Text2: *; Text1: *; Value: MMBD1203; SAAB PN: *; Part Number: MMBD1203; DCE Part No: *
footprint SOT23 (SOT23, 3-Leads, Body 3.0x1.4mm (max), Pitch 0.95mm, IPC Medium Density)
pins: 1 A1, 2 A2, 3 C

## MMBD1501A_SOT23
designator D?, comment MMBD1501A
Diode Small Signal 200V 200mA; Manufacturer: On Semi; Reutech PN: 5961-RE-0084; Package: SOT23; EDM-PN: *; Text2: *; Text1: *; Value: MMBD1501A; SAAB PN: *; Part Number: MMBD1501A; DCE Part No: *
footprint SOT23 (SOT23, 3-Leads, Body 3.0x1.4mm (max), Pitch 0.95mm, IPC Medium Density)
pins: 1 A, 3 C

## MMBD1503A_SOT23
designator D?, comment MMBD1503A
Diode Array 1 Pair Series 200V 200mA; Manufacturer: On Semi; Package: SOT23; EDM-PN: *; Text2: *; Text1: *; Value: MMBD1503A; Reutech PN: *; SAAB PN: *; Part Number: MMBD1503A; DCE Part No: *
footprint SOT23 (SOT23, 3-Leads, Body 3.0x1.4mm (max), Pitch 0.95mm, IPC Medium Density)
pins: 1 A1, 2 A2, 3 C

## MMBD1503A_SOT23-X
designator D?, comment MMBD1503A
Diode Array 1 Pair Series 200V 200mA; Manufacturer: On Semi; Package: SOT23; EDM-PN: *; Text2: *; Text1: *; Value: MMBD1503A; Reutech PN: *; SAAB PN: *; Part Number: MMBD1503A; DCE Part No: *
footprint SOT23 (SOT23, 3-Leads, Body 3.0x1.4mm (max), Pitch 0.95mm, IPC Medium Density)
pins: 1 A1, 2 A2, 3 C

## MMBD4148_SOT23
designator D?, comment MMBD4148
Diode Small Signal; Manufacturer: Fairchild; Reutech PN: 5961-SW-0017; Package: SOT23; EDM-PN: *; Text2: *; Text1: *; Value: MMBD4148; SAAB PN: *; Part Number: MMBD4148; DCE Part No: *
footprint SOT23 (SOT23, 3-Leads, Body 3.0x1.4mm (max), Pitch 0.95mm, IPC Medium Density)
pins: 1 A, 3 C

## MMBD4148TW_SOT363
designator D?, comment MMBD4148TW
Diode Small Signal Array; Manufacturer: Diodes; Package: SOT363-6-D; EDM-PN: *; Text2: *; Text1: *; Value: MMBD4148TW; SAAB PN: *; Part Number: MMBD4148TW; DCE Part No: *
footprint SOT363-6-D (SOT363 1.35x2.2mm 6lead)
pins: 1 A, 2, 3, 4, 5, 6

## MMSD914T1G_SOD123
designator D?, comment MMSD914T1G
Diode Standard 100V 200mA; Manufacturer: On Semi; Package: SOD123; EDM-PN: *; Text2: *; Text1: *; Value: MMSD914T1G; SAAB PN: *; Part Number: MMSD914T1G; DCE Part No: *
footprint SOD123 (SOD 123 2.85x1.7mm)
pins: 1 C, 2 A

## MRA4003T3-SMA
designator D?, comment MRA4003T3
Diode Power Rectifier 1A 300V; Manufacturer: On Semi; Package: SMA; EDM-PN: *; Text2: *; Text1: *; Value: MRA4003T3; SAAB PN: *; Part Number: MRA4003T3; DCE Part No: *
footprint SMA (SMA 5.6x2.95mm)
pins: 1 C, 2 A

## MRA4007T3-SMA
designator D?, comment MRA4007T3
Diode Power Rectifier 1A 1000V; Manufacturer: On Semi; Package: SMA; EDM-PN: *; Text2: *; Text1: *; Value: MRA4007T3; SAAB PN: *; Part Number: MRA4007T3; DCE Part No: *
footprint SMA (SMA 5.6x2.95mm)
pins: 1 C, 2 A

## MURA130T3G-SMA
designator D?, comment MURA130T3G
Diode Ultrafast Rectifier 1A 300V; Manufacturer: On Semi; Package: SMA; EDM-PN: *; Text2: *; Text1: *; Value: MURA130T3G; SAAB PN: *; Part Number: MURA130T3G; DCE Part No: *
footprint SMA (SMA 5.6x2.95mm)
pins: 1 C, 2 A

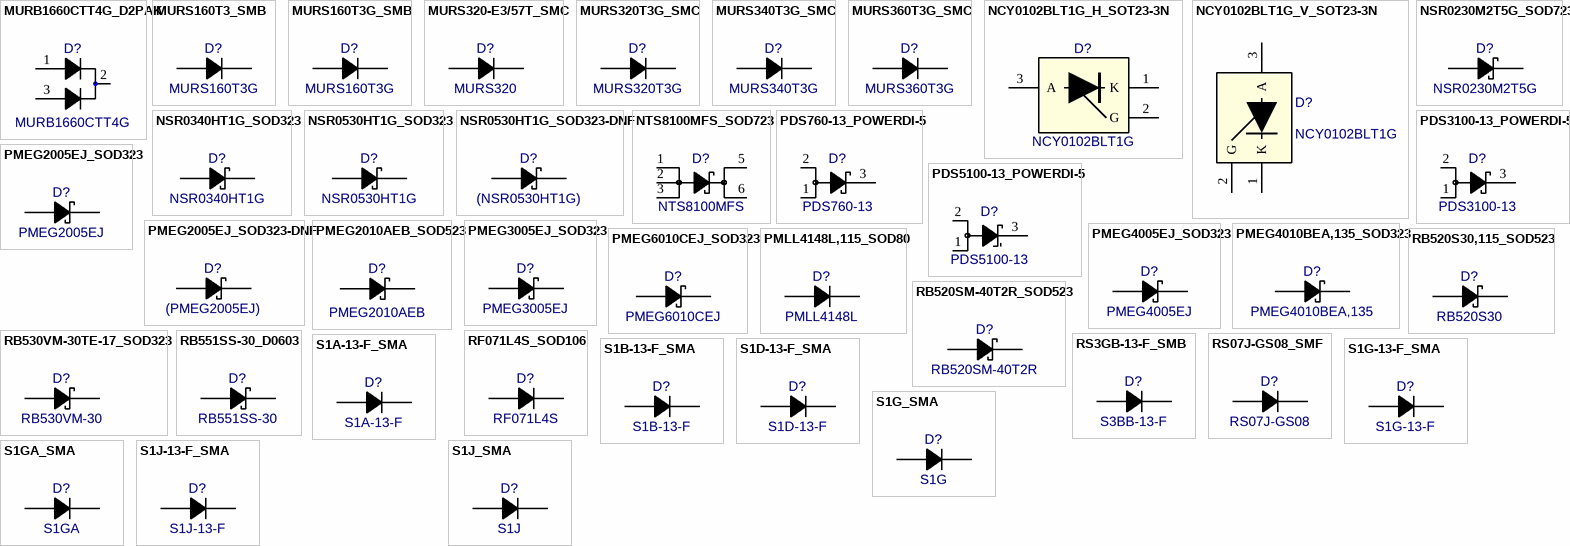
[diagram p6: symbols MURB1660CTT4G_D2PAK to S1J_SMA]

## MURB1660CTT4G_D2PAK
designator D?, comment MURB1660CTT4G
Diode Power Rectifier 600V 16A; Manufacturer: On Semi; Package: D2PAK; EDM-PN: *; Text2: *; Text1: *; Value: MURB1660CTT4G; SAAB PN: *; Part Number: MURB1660CTT4G; DCE Part No: *
footprint D2PAK (D2-PAK, 3-Pads, Body 9.4x10.4mm (max), IPC Medium Density)
pins: 1 A1, 2 C, 3 A2

## MURS160T3_SMB
designator D?, comment MURS160T3G
Diode Ultrafast Power Rectifier 600V 1A; Manufacturer: On Semi; Package: SMB; EDM-PN: *; Text2: *; Text1: *; Value: MURS160T3G; SAAB PN: *; Part Number: MURS160T3G; DCE Part No: *
footprint SMB (SMB 4.75x3.94mm)
pins: 1 C, 2 A

## MURS160T3G_SMB
designator D?, comment MURS160T3G
Diode Ultrafast Power Rectifier 600V 1A; Manufacturer: On Semi; Package: SMB; EDM-PN: *; Text2: *; Text1: *; Value: MURS160T3G; SAAB PN: *; Part Number: MURS160T3G; DCE Part No: *
footprint SMB (SMB 4.75x3.94mm)
pins: 1 C, 2 A

## MURS320-E3/57T_SMC
designator D?, comment value MURS320  (hidden comment: MURS320-E3/57T)
Diode Rectifier 200V 3A; Manufacturer: Vishay; EDM-PN: DIO236; SAAB PN: 1AJV00002AEA; Package: SMC; Text2: *; Text1: *; Part Number: MURS320-E3/57T; DCE Part No: *
footprint SMC (Molded Diode, 2-Leads, Body 6.9x5.8mm, IPC Medium Density)
pins: 1 C, 2 A

## MURS320T3G_SMC
designator D?, comment MURS320T3G
Diode Rectifier 200V 3A; Manufacturer: On Semi; Package: SMC; EDM-PN: *; Text2: *; Text1: *; Value: MURS320T3G; SAAB PN: *; Part Number: MURS320T3G; DCE Part No: *
footprint SMC (Molded Diode, 2-Leads, Body 6.9x5.8mm, IPC Medium Density)
pins: 1 C, 2 A

## MURS340T3G_SMC
designator D?, comment MURS340T3G
Diode Rectifier 400V 3A; Manufacturer: On Semi; Package: SMC; EDM-PN: *; Text2: *; Text1: *; Value: MURS340T3G; SAAB PN: *; Part Number: MURS340T3G; DCE Part No: *
footprint SMC (Molded Diode, 2-Leads, Body 6.9x5.8mm, IPC Medium Density)
pins: 1 C, 2 A

## MURS360T3G_SMC
designator D?, comment MURS360T3G
Diode Rectifier 600V 3A; Manufacturer: On Semi; Package: SMC; EDM-PN: *; Text2: *; Text1: *; Value: MURS360T3G; SAAB PN: *; Part Number: MURS360T3G; DCE Part No: *
footprint SMC (Molded Diode, 2-Leads, Body 6.9x5.8mm, IPC Medium Density)
pins: 1 C, 2 A

## NCY0102BLT1G_H_SOT23-3N
designator D?, comment NCY0102BLT1G
SCR 200V 250mA; Manufacturer: On Semi; Package: SOT23; EDM-PN: *; Text2: *; Text1: *; Value: NCY0102BLT1G; SAAB PN: *; Part Number: NCY0102BLT1G; DCE Part No: *
footprint SOT23 (SOT23, 3-Leads, Body 3.0x1.4mm (max), Pitch 0.95mm, IPC Medium Density)
pins: 1 K, 2 G, 3 A

## NCY0102BLT1G_V_SOT23-3N
designator D?, comment NCY0102BLT1G
SCR 200V 250mA; Manufacturer: On Semi; Package: SOT23; EDM-PN: *; Text2: *; Text1: *; Value: NCY0102BLT1G; SAAB PN: *; Part Number: NCY0102BLT1G; DCE Part No: *
footprint SOT23 (SOT23, 3-Leads, Body 3.0x1.4mm (max), Pitch 0.95mm, IPC Medium Density)
pins: 1 K, 2 G, 3 A

## NSR0230M2T5G_SOD723
designator D?, comment NSR0230M2T5G
Diode Schottky (30Volt 0.2A); Manufacturer: On Semi; Package: SOD723; EDM-PN: *; Text2: *; Text1: *; Part Number: NSR0230M2T5G; SAAB PN: *; Value: NSR0230M2T5G; DCE Part No: *
footprint SOD723 (SOD723 1.0x0.6mm)
pins: 1 C, 2 A

## NSR0340HT1G_SOD323
designator D?, comment NSR0340HT1G
Diode Schottky Barrier (40Volt 0.25A); Manufacturer: On Semi; Package: SOD323; EDM-PN: *; Text2: *; Text1: *; Part Number: NSR0340HT1G; SAAB PN: *; Value: NSR0340HT1G; DCE Part No: *
footprint SOD323 (Diode, SOD323 2-Leads, Body 1.7x1.25mm, IPC Medium Density)
pins: 1 C, 2 A